# Altium footprint library PcbLib1.PcbLib: 32 footprints (part 2 of 2)
Each footprint in its own frame and in the unit in brackets; x right, y up, seen from the top. Pads: shape width x height; smd on the part's side, far side on the other; paste and mask are expansions set on the pad; w line width, h text height; cw(c..) or ccw(c..) is an arc to the next point about the centre after c.
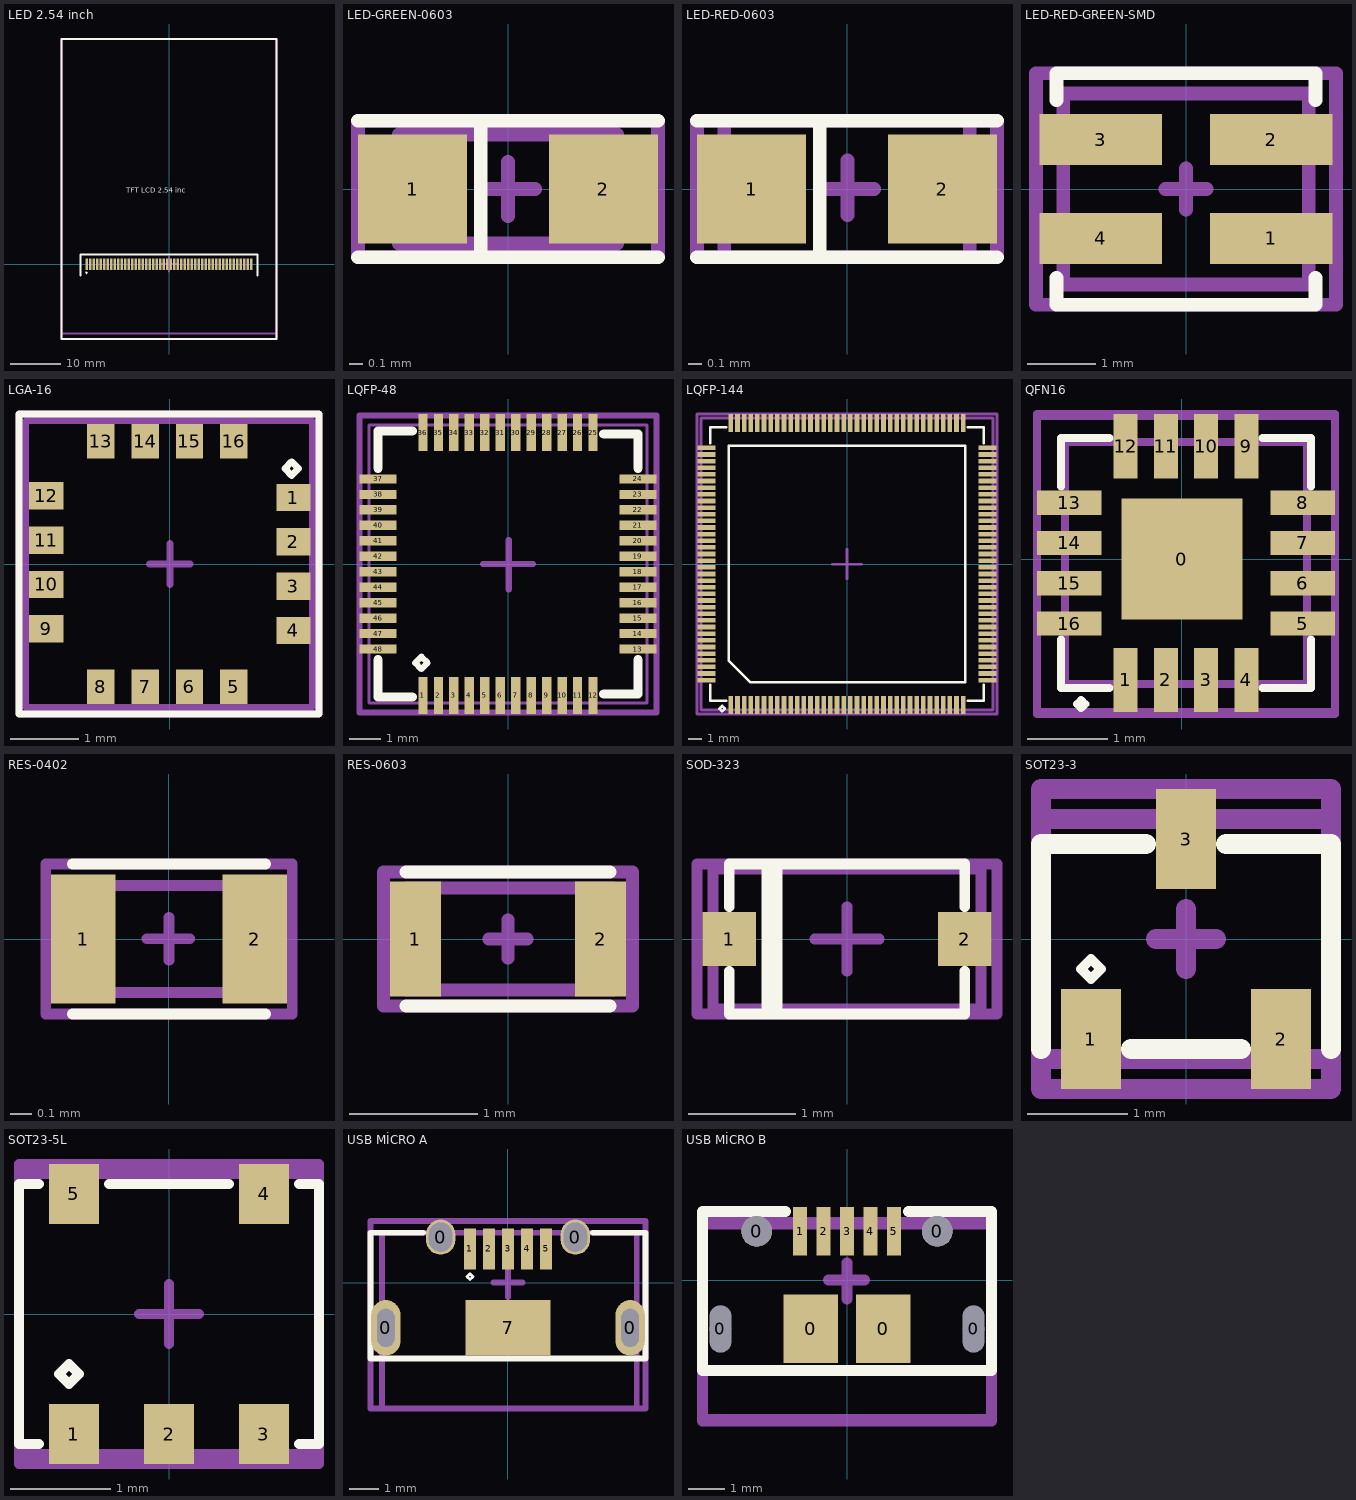
[diagram p1: the footprints below, top view; thin cyan lines are the x and y axes]

## LED 2.54 inch [mm]
pads (49):
  rect 0.5x2.3 smd mask+0.005: 1(-16.45,0) 1(-16.45,0) 2(-15.75,0) 3(-15.05,0) 4(-14.35,0) 5(-13.65,0) 6(-12.95,0) 7(-12.25,0) 8(-11.55,0) 9(-10.85,0) 10(-10.15,0) 11(-9.45,0) 12(-8.75,0) 13(-8.05,0) 14(-7.35,0) 15(-6.65,0) 16(-5.95,0) 17(-5.25,0) 18(-4.55,0) 19(-3.85,0) 20(-3.15,0) 21(-2.45,0) 22(-1.75,0) 23(-1.05,0) 24(-0.35,0) 25(0.35,0) 26(1.05,0) 27(1.75,0) 28(2.45,0) 29(3.15,0) 30(3.85,0) 31(4.55,0) 32(5.25,0) 33(5.95,0) 34(6.65,0) 35(7.35,0) 36(8.05,0) 37(8.75,0) 38(9.45,0) 39(10.15,0) 40(10.85,0) 41(11.55,0) 42(12.25,0) 43(12.95,0) 44(13.65,0) 45(14.35,0) 46(15.05,0) 47(15.75,0) 48(16.45,0)
Top Overlay:
  lines w0.2: -16.7,-1.7 -16.5,-1.5 -16.3,-1.7 -16.5,-1.9 -16.7,-1.7
  lines w0.4: -17.702,-2.269 -17.702,1.931 17.698,1.931 17.698,-2.269 ; -21.5,-14.95 -21.5,45.05 21.5,45.05 21.5,-14.95 -21.5,-14.95
  text "TFT LCD 2.54 inc" at -8.5,14.3 h1
Top Compenent Center:
  lines w0.4: -1.5,0 1.5,0 ; 0,-1.5 0,1.5 ; -21.5,-14.95 -21.5,45.05 21.5,45.05 21.5,-14.95 -21.5,-14.95
Top 3D Body:
  lines w0.4: -21.5,-13.9 -21.5,45.05 21.5,45.05 21.5,-13.9 -21.5,-13.9
Top Designator:
  lines w0.4: -21.5,-14.95 -21.5,45.05 21.5,45.05 21.5,-14.95 -21.5,-14.95
  text ".Designator" at -5.646,12.387 h1
3D body: height 1, standoff 0, extent -17.5,-14.9 17.5,1.15
3D body: height 3.55, standoff 0.2, extent -19.5,-5.95 19.5,42.05
3D body: height 3.5, standoff 0.1, extent -21.5,-14.95 21.5,45.05
3D body: height 1, standoff 0, extent 17.5,-14.9 19.8,-8.4
3D body: height 3, standoff 0, extent -15.5,-15.4 15.5,-14.9

## LED-GREEN-0603 [mm]
pads (2):
  rect 0.8x0.8 smd mask+0.005: 1(-0.7,0) 2(0.7,0)
Top Overlay:
  lines w0.1: -1.1,-0.5 1.1,-0.5 ; -1.1,0.5 1.1,0.5 ; -0.2,-0.5 -0.2,0.5
Top Compenent Center:
  lines w0.1: -0.2,0 0.2,0 ; 0,-0.2 0,0.2 ; -1.1,-0.5 1.1,-0.5 1.1,0.5 -1.1,0.5 -1.1,-0.5
Top 3D Body:
  lines w0.1: -0.8,-0.4 0.8,-0.4 0.8,0.4 -0.8,0.4 -0.8,-0.4
Top Designator:
  lines w0.1: -1.1,-0.5 1.1,-0.5 1.1,0.5 -1.1,0.5 -1.1,-0.5
  text ".Designator" at -1.546,0.887 h1
3D body "150060VS75000--3DModel-STEP-510211.STEP": height 0.8, standoff 0, extent -0.8,-0.4 0.8,0.4

## LED-RED-0603 [mm]
pads (2):
  rect 0.8x0.8 smd mask+0.005: 1(-0.7,0) 2(0.7,0)
Top Overlay:
  lines w0.1: -1.1,-0.5 1.1,-0.5 ; -1.1,0.5 1.1,0.5 ; -0.2,-0.5 -0.2,0.5
Top Compenent Center:
  lines w0.1: -0.2,0 0.2,0 ; 0.003,-0.191 0.003,0.209 ; -1.1,-0.5 -1.1,0.5 1.1,0.5 1.1,-0.5 -1.1,-0.5
Top 3D Body:
  lines w0.1: -0.9,-0.5 -0.9,0.5 0.9,0.5 0.9,-0.5 -0.9,-0.5
Top Designator:
  lines w0.1: -1.1,-0.5 1.1,-0.5 1.1,0.5 -1.1,0.5 -1.1,-0.5
  text ".Designator" at -1.846,0.987 h1
3D body "led0603_RED.step": height 0.9, standoff 0, extent -0.85,-0.45 0.85,0.45

## LED-RED-GREEN-SMD [mm]
pads (4):
  rect 1.8x0.75 smd mask+0.005: 1(1.25,-0.725) 2(1.25,0.725) 3(-1.25,0.725) 4(-1.25,-0.725)
Top Overlay:
  lines w0.2: -1.9,-1.3 -1.9,-1.7 1.9,-1.7 1.9,-1.3 ; -1.9,1.3 -1.9,1.7 1.9,1.7 1.9,1.3
Top Compenent Center:
  lines w0.2: -0.3,0 0.3,0 ; 0,-0.3 0,0.3 ; -2.2,-1.7 2.2,-1.7 2.2,1.7 -1.9,1.7 -2.2,1.7 -2.2,-1.7
Top 3D Body:
  lines w0.2: -1.8,-1.4 -1.8,1.4 1.8,1.4 1.8,-1.4 -1.8,-1.4
Top Designator:
  lines w0.2: -2.2,-1.7 2.2,-1.7 2.2,1.7 -1.9,1.7 -2.2,1.7 -2.2,-1.7
  text ".Designator" at -3.146,2.187 h1
3D body "User Library-Osram_Led_PLCC4-2.step": height 1.95, standoff 0, extent -1.75,-1.4 1.75,1.4

## LGA-16 [mm]
pads (16):
  rect 0.5x0.4 smd mask+0.005: 1(1.813,0.975) 2(1.813,0.325) 3(1.813,-0.325) 4(1.813,-0.975) 9(-1.813,-0.95) 10(-1.813,-0.3) 11(-1.813,0.35) 12(-1.813,1)
  rect 0.4x0.5 smd mask+0.005: 5(0.937,-1.8) 6(0.288,-1.8) 7(-0.363,-1.8) 8(-1.012,-1.8) 13(-1.012,1.8) 14(-0.363,1.8) 15(0.288,1.8) 16(0.937,1.8)
Top Overlay:
  lines w0.1: -2.213,-2.2 -2.213,2.2 2.188,2.2 2.188,-2.2 -2.213,-2.2 ; 1.687,1.4 1.787,1.3 1.887,1.4 1.787,1.5 1.687,1.4
Top Compenent Center:
  lines w0.1: -0.3,0 0.3,0 ; 0,-0.3 0,0.3 ; -2.213,-2.2 -2.213,2.2 2.188,2.2 2.188,-2.2 -2.213,-2.2
Top 3D Body:
  lines w0.1: -2.113,-2.1 2.087,-2.1 2.087,2.1 -2.113,2.1 -2.113,-2.1
Top Designator:
  lines w0.1: -2.213,-2.2 2.188,-2.2 2.188,2.2 -2.213,2.2 -2.213,-2.2
  text ".Designator" at -4.558,3.087 h1
3D body "LGA-16_4X4X1_STM.step": height 0.99, standoff 0, extent -2.083,-2.07 2.058,2.07

## LQFP-48 [mm]
pads (48):
  rect 0.3x1.2 smd mask+0.005: 1(-2.75,-4.25) 2(-2.25,-4.25) 3(-1.75,-4.25) 4(-1.25,-4.25) 5(-0.75,-4.25) 6(-0.25,-4.25) 7(0.25,-4.25) 8(0.75,-4.25) 9(1.25,-4.25) 10(1.75,-4.25) 11(2.25,-4.25) 12(2.75,-4.25) 25(2.75,4.25) 26(2.25,4.25) 27(1.75,4.25) 28(1.25,4.25) 29(0.75,4.25) 30(0.25,4.25) 31(-0.25,4.25) 32(-0.75,4.25) 33(-1.25,4.25) 34(-1.75,4.25) 35(-2.25,4.25) 36(-2.75,4.25)
  rect 1.2x0.3 smd mask+0.005: 13(4.2,-2.75) 14(4.2,-2.25) 15(4.2,-1.75) 16(4.2,-1.25) 17(4.2,-0.75) 18(4.2,-0.25) 19(4.2,0.25) 20(4.2,0.75) 21(4.2,1.25) 22(4.2,1.75) 23(4.2,2.25) 24(4.2,2.75) 37(-4.2,2.75) 38(-4.2,2.25) 39(-4.2,1.75) 40(-4.2,1.25) 41(-4.2,0.75) 42(-4.2,0.25) 43(-4.2,-0.25) 44(-4.2,-0.75) 45(-4.2,-1.25) 46(-4.2,-1.75) 47(-4.2,-2.25) 48(-4.2,-2.75)
Top Overlay:
  lines w0.2: -3,-3.2 -2.8,-3.4 -2.6,-3.2 -2.8,-3 -3,-3.2
  lines w0.3: -4.2,-3.1 -4.2,-4.3 -3.1,-4.3 ; -4.2,3.1 -4.2,4.3 -3.1,4.3 ; 3.1,-4.2 4.2,-4.2 4.2,-3.1 ; 3.1,4.2 4.2,4.2 4.2,3.1
Top Compenent Center:
  lines w0.2: -0.8,0 0.8,0 ; 0.024,-0.823 0.024,0.777 ; -4.8,-4.8 -4.8,4.8 4.8,4.8 4.8,-4.8 -4.8,-4.8
Top 3D Body:
  lines w0.1: -4.5,-4.5 4.5,-4.5 4.5,4.5 -4.5,4.5 -4.5,-4.5
Top Designator:
  lines w0.2: -4.8,-4.8 -4.8,4.8 4.8,4.8 4.8,-4.8 -4.8,-4.8
  text ".Designator" at -4.946,2.187 h1
3D body "LQFP48.STEP": height 1.6, standoff 0, extent -4.509,-4.509 4.509,4.509

## LQFP-144 [mm]
pads (148):
  rect 0.35x1.35 smd mask+0.005: 1(-8.75,-10.625) 1(-8.75,-10.625) 2(-8.25,-10.625) 3(-7.75,-10.625) 4(-7.25,-10.625) 5(-6.75,-10.625) 6(-6.25,-10.625) 7(-5.75,-10.625) 8(-5.25,-10.625) 9(-4.75,-10.625) 10(-4.25,-10.625) 11(-3.75,-10.625) 12(-3.25,-10.625) 13(-2.75,-10.625) 14(-2.25,-10.625) 15(-1.75,-10.625) 16(-1.25,-10.625) 17(-0.75,-10.625) 18(-0.25,-10.625) 19(0.25,-10.625) 20(0.75,-10.625) 21(1.25,-10.625) 22(1.75,-10.625) 23(2.25,-10.625) 24(2.75,-10.625) 25(3.25,-10.625) 26(3.75,-10.625) 27(4.25,-10.625) 28(4.75,-10.625) 29(5.25,-10.625) 30(5.75,-10.625) 31(6.25,-10.625) 32(6.75,-10.625) 33(7.25,-10.625) 34(7.75,-10.625) 35(8.25,-10.625) 36(8.75,-10.625) 73(8.75,10.625) 73(8.75,10.625) 74(8.25,10.625) 75(7.75,10.625) 76(7.25,10.625) 77(6.75,10.625) 78(6.25,10.625) 79(5.75,10.625) 80(5.25,10.625) 81(4.75,10.625) 82(4.25,10.625) 83(3.75,10.625) 84(3.25,10.625) 85(2.75,10.625) 86(2.25,10.625) 87(1.75,10.625) 88(1.25,10.625) 89(0.75,10.625) 90(0.25,10.625) 91(-0.25,10.625) 92(-0.75,10.625) 93(-1.25,10.625) 94(-1.75,10.625) 95(-2.25,10.625) 96(-2.75,10.625) 97(-3.25,10.625) 98(-3.75,10.625) 99(-4.25,10.625) 100(-4.75,10.625) 101(-5.25,10.625) 102(-5.75,10.625) 103(-6.25,10.625) 104(-6.75,10.625) 105(-7.25,10.625) 106(-7.75,10.625) 107(-8.25,10.625) 108(-8.75,10.625)
  rect 1.35x0.35 smd mask+0.005: 37(10.6,-8.75) 37(10.6,-8.75) 38(10.6,-8.25) 39(10.6,-7.75) 40(10.6,-7.25) 41(10.6,-6.75) 42(10.6,-6.25) 43(10.6,-5.75) 44(10.6,-5.25) 45(10.6,-4.75) 46(10.6,-4.25) 47(10.6,-3.75) 48(10.6,-3.25) 49(10.6,-2.75) 50(10.6,-2.25) 51(10.6,-1.75) 52(10.6,-1.25) 53(10.6,-0.75) 54(10.6,-0.25) 55(10.6,0.25) 56(10.6,0.75) 57(10.6,1.25) 58(10.6,1.75) 59(10.6,2.25) 60(10.6,2.75) 61(10.6,3.25) 62(10.6,3.75) 63(10.6,4.25) 64(10.6,4.75) 65(10.6,5.25) 66(10.6,5.75) 67(10.6,6.25) 68(10.6,6.75) 69(10.6,7.25) 70(10.6,7.75) 71(10.6,8.25) 72(10.6,8.75) 109(-10.6,8.75) 109(-10.6,8.75) 110(-10.6,8.25) 111(-10.6,7.75) 112(-10.6,7.25) 113(-10.6,6.75) 114(-10.6,6.25) 115(-10.6,5.75) 116(-10.6,5.25) 117(-10.6,4.75) 118(-10.6,4.25) 119(-10.6,3.75) 120(-10.6,3.25) 121(-10.6,2.75) 122(-10.6,2.25) 123(-10.6,1.75) 124(-10.6,1.25) 125(-10.6,0.75) 126(-10.6,0.25) 127(-10.6,-0.25) 128(-10.6,-0.75) 129(-10.6,-1.25) 130(-10.6,-1.75) 131(-10.6,-2.25) 132(-10.6,-2.75) 133(-10.6,-3.25) 134(-10.6,-3.75) 135(-10.6,-4.25) 136(-10.6,-4.75) 137(-10.6,-5.25) 138(-10.6,-5.75) 139(-10.6,-6.25) 140(-10.6,-6.75) 141(-10.6,-7.25) 142(-10.6,-7.75) 143(-10.6,-8.25) 144(-10.6,-8.75)
Top Overlay:
  lines w0.2: -10.3,-9.1 -10.3,-10.3 -9.1,-10.3 ; -10.3,9.1 -10.3,10.3 -9.1,10.3 ; 9.1,-10.3 10.3,-10.3 10.3,-9.1 ; 9.1,10.3 10.3,10.3 10.3,9.1 ; -9.6,-10.9 -9.4,-10.7 -9.2,-10.9 -9.4,-11.1 -9.6,-10.9 ; -8.9,-7.3 -7.3,-8.9 8.9,-8.9 8.9,8.9 -8.9,8.9 -8.9,-7.3
Top Compenent Center:
  lines w0.2: -1.089,-0.019 1.111,-0.019 ; 0,-1.1 0,1.1 ; -11.3,-11.3 11.3,-11.3 11.3,11.3 -9.2,11.3 -11.3,11.3 -11.3,-11.3
Top 3D Body:
  lines w0.2: -11,-11 -11,11 11,11 11,-11 -11,-11
Top Designator:
  lines w0.2: -11.3,-11.3 -11.3,11.3 -9.2,11.3 11.3,11.3 11.3,-11.3 -11.3,-11.3
  text ".Designator" at -4.846,3.487 h1
3D body "STM32F4.step": height 2, standoff 0.1, extent -11,-11 11,11

## QFN16 [mm]
pads (17):
  rect 1.5x1.5 smd mask+0.005: 0(0,0)
  rect 0.3x0.8 smd mask+0.005: 1(-0.7,-1.5) 2(-0.2,-1.5) 3(0.3,-1.5) 4(0.8,-1.5) 9(0.8,1.4) 10(0.3,1.4) 11(-0.2,1.4) 12(-0.7,1.4)
  rect 0.8x0.3 smd mask+0.005: 5(1.5,-0.8) 6(1.5,-0.3) 7(1.5,0.2) 8(1.5,0.7) 13(-1.4,0.7) 14(-1.4,0.2) 15(-1.4,-0.3) 16(-1.4,-0.8)
Top Overlay:
  lines w0.1: -1.5,-1 -1.5,-1.6 -0.9,-1.6 ; -1.5,0.9 -1.5,1.5 -0.9,1.5 ; 1,-1.6 1.6,-1.6 1.6,-1 ; 1,1.5 1.6,1.5 1.6,0.9 ; -1.3,-1.8 -1.25,-1.85 -1.2,-1.8 -1.25,-1.75 -1.3,-1.8
Top Compenent Center:
  lines w0.1: -0.291,-0.022 0.309,-0.022 ; 0,-0.3 0,0.3 ; -1.8,-1.922 -1.8,1.778 1.9,1.778 1.9,-1.922 -1.8,-1.922
Top 3D Body:
  lines w0.1: -1.45,-1.55 -1.45,1.45 1.55,1.45 1.55,-1.55 -1.45,-1.55
Top Designator:
  lines w0.1: -1.8,-1.9 -1.8,1.8 1.9,1.8 1.9,-1.9 -1.8,-1.9
  text ".Designator" at -2.146,2.187 h1
3D body "MAX5487ETE+T.STEP": height 0.8, standoff 0, extent -1.45,-1.55 1.55,1.45

## RES-0402 [mm]
pads (2):
  rect 0.3x0.6 smd mask+0.005: 1(-0.4,0) 2(0.4,0)
Top Overlay:
  lines w0.05: -0.45,-0.35 0.45,-0.35 ; -0.45,0.35 0.45,0.35
Top Compenent Center:
  lines w0.05: -0.103,0.001 0.097,0.001 ; 0,-0.099 0,0.1 ; -0.575,-0.35 -0.575,0.35 0.575,0.35 0.575,-0.35 -0.575,-0.35
Top 3D Body:
  lines w0.05: -0.5,-0.25 -0.5,0.25 0.5,0.25 0.5,-0.25 -0.5,-0.25
Top Designator:
  lines w0.05: -0.575,-0.35 -0.575,0.35 0.575,0.35 0.575,-0.35 -0.575,-0.35
  text ".Designator" at -0.796,-0.288 h1
3D body "RC0402FR-07330RL.step": height 0.4, standoff 0, extent -0.5,-0.25 0.5,0.25

## RES-0603 [mm]
pads (2):
  rect 0.4x0.9 smd mask+0.005: 1(-0.725,0) 2(0.725,0)
Top Overlay:
  lines w0.1: -0.8,-0.525 0.8,-0.525 ; -0.8,0.525 0.8,0.525
Top Compenent Center:
  lines w0.1: -0.15,0 0.15,0 ; 0,-0.15 0,0.15 ; -0.975,-0.525 0.975,-0.525 0.975,0.525 -0.975,0.525 -0.975,-0.525
Top 3D Body:
  lines w0.1: -0.8,-0.4 0.825,-0.4 0.825,0.4 -0.8,0.4 -0.8,-0.4
Top Designator:
  lines w0.1: -0.975,-0.525 0.975,-0.525 0.975,0.525 -0.975,0.525 -0.975,-0.525
  text ".Designator" at -0.771,-0.213 h1
3D body "RC0603FR-0722RL.step": height 0.55, standoff 0, extent -0.8,-0.4 0.8,0.4

## SHUNT [mm]
3D body "MNT-101-BK-G.stp": height 0, standoff -6.1, extent -2.54,-1.27 2.54,1.27

## SOD-323 [mm]
pads (2):
  rect 0.5x0.5 smd mask+0.005: 1(-1.1,0) 2(1.1,0)
Top Overlay:
  lines w0.1: -1.1,-0.3 -1.1,-0.7 1.1,-0.7 1.1,-0.3 ; -1.1,0.3 -1.1,0.7 1.1,0.7 1.1,0.3
  lines w0.2: -0.7,-0.647 -0.7,0.646
Top Compenent Center:
  lines w0.1: -0.3,0 0.3,0 ; 0,-0.3 0,0.3 ; -1.4,-0.7 -1.4,0.7 1.4,0.7 1.4,-0.7 -1.4,-0.7
Top 3D Body:
  lines w0.1: -1.25,-0.65 -1.25,0.65 1.25,0.65 1.25,-0.65 -1.25,-0.65
Top Designator:
  lines w0.1: -1.4,-0.7 -1.4,0.7 1.4,0.7 1.4,-0.7 -1.4,-0.7
  text ".Designator" at -3.071,1.012 h1
3D body "BAT60JFILM.step": height 1.17, standoff 0, extent -1.25,-0.64 1.25,0.64

## SOT23-3 [mm]
pads (3):
  rect 0.6x1 smd mask+0.005: 1(-0.95,-1) 2(0.95,-1) 3(0,1)
Top Overlay:
  lines w0.1: -1.05,-0.3 -0.95,-0.4 -0.85,-0.3 -0.95,-0.2 -1.05,-0.3
  lines w0.2: -1.45,-1.1 -1.45,0.95 -0.4,0.95 ; -0.55,-1.1 0.55,-1.1 ; 0.4,0.95 1.45,0.95 1.45,-1.1
Top Compenent Center:
  lines w0.2: -0.3,0 0.3,0 ; 0,-0.3 0,0.3 ; -1.45,-1.5 -1.45,1.5 1.45,1.5 1.45,-1.5 -1.45,-1.5
Top 3D Body:
  lines w0.2: -1.45,-1.2 1.45,-1.2 1.45,1.2 -1.45,1.2 -1.45,-1.2
Top Designator:
  lines w0.2: -1.45,-1.5 -1.45,1.5 1.45,1.5 1.45,-1.5 -1.45,-1.5
  text ".Designator" at -3.046,2.087 h1
3D body "MMBT2222ALT1G.step": height 1.11, standoff 0, extent -1.46,-1.185 1.46,1.185

## SOT23-5L [mm]
pads (5):
  rect 0.5x0.6 smd mask+0.005: 1(-0.95,-1.2) 2(0,-1.2) 3(0.95,-1.2) 4(0.95,1.2) 5(-0.95,1.2)
Top Overlay:
  lines w0.1: -1.3,-1.3 -1.5,-1.3 -1.5,1.3 -1.3,1.3 ; -0.6,1.3 0.6,1.3 ; 1.3,-1.3 1.5,-1.3 1.5,1.3 1.3,1.3 ; -1.1,-0.6 -1,-0.7 -0.9,-0.6 -1,-0.5 -1.1,-0.6
Top Compenent Center:
  lines w0.1: -0.3,0 0.3,0 ; 0,-0.3 0,0.3 ; -1.5,-1.5 1.5,-1.5 1.5,1.5 -1.5,1.5 -1.5,-1.5
Top 3D Body:
  lines w0.1: -1.5,-1.4 1.5,-1.4 1.5,1.4 -1.5,1.4 -1.5,-1.4
Top Designator:
  lines w0.1: -1.5,-1.5 1.5,-1.5 1.5,1.5 -1.5,1.5 -1.5,-1.5
  text ".Designator" at -3.646,1.787 h1
3D body "LD3985M33R.step": height 1.45, standoff 0, extent -1.462,-1.4 1.462,1.4

## USB MİCRO A [mm]
pads (10):
  oval 1x1.9 hole 0.6 slot 1.3 at 90 deg mask+0.005: 0(-4.175,-1.55) 0(4.175,-1.55)
  oval 1x1.2 hole 0.8 slot 1 at 90 deg mask+0.005: 0(-2.3,1.55) 0(2.3,1.55)
  rect 0.4x1.4 smd mask+0.005: 1(-1.3,1.15) 2(-0.65,1.15) 3(0,1.15) 4(0.65,1.15) 5(1.3,1.15)
  rect 2.9x1.9 smd mask+0.005: 7(0,-1.55)
Top Overlay:
  lines w0.1: -1.4,0.2 -1.3,0.1 -1.2,0.2 -1.3,0.3 -1.4,0.2
  lines w0.2: -2.9,1.7 -4.7,1.7 -4.7,-2.6 4.7,-2.6 4.7,1.7 2.9,1.7
Top Compenent Center:
  lines w0.2: -0.5,0 0.5,0 ; 0,-0.5 0,0.5 ; -4.7,-4.3 -4.7,2.1 4.7,2.1 4.7,-4.3 -4.7,-4.3
Top 3D Body:
  lines w0.2: -4.3,-4.3 4.4,-4.3 4.4,1.7 -4.3,1.7 -4.3,-4.3
Top Designator:
  lines w0.2: -4.7,-4.3 -4.7,2.1 4.7,2.1 4.7,-4.3 -4.7,-4.3
  text ".Designator" at -4.946,-1.813 h1
3D body "0475900001.step": height 2.71, standoff -0.65, extent -4.3,-4.25 4.35,1.65

## USB MİCRO B [mm]
pads (11):
  round 0.6 hole 0.6 slot 1.3 at 90 deg mask+0.005: 0(-3.5,-1.35) 0(3.5,-1.35)
  round 0.85 hole 0.85 mask+0.005: 0(-2.5,1.35) 0(2.5,1.35)
  rect 1.5x1.9 smd mask+0.005: 0(-1,-1.35) 0(1,-1.35)
  rect 0.4x1.35 smd mask+0.005: 1(-1.3,1.35) 2(-0.65,1.35) 3(0,1.35) 4(0.65,1.35) 5(1.3,1.35)
Top Overlay:
  lines w0.3: -1.7,1.9 -4,1.9 -4,-2.5 4,-2.5 4,1.9 1.7,1.9
Top Compenent Center:
  lines w0.3: -0.514,0 0.486,0 ; 0,-0.519 0,0.481 ; -4,-3.9 4,-3.9 4,1.6 -4,1.6 -4,-3.9
Top 3D Body:
  lines w0.3: -4,-3.85 -4,1.55 4,1.55 4,-3.85 -4,-3.85
Top Designator:
  lines w0.3: -4,-3.9 4,-3.9 4,1.6 -4,1.6 -4,-3.9
  text ".Designator" at -4.246,2.387 h1
3D body "1050170001.step": height 2.75, standoff -0.73, extent -4,-3.85 4,1.55